# Altium footprint library Metric_SMD.PcbLib: 185 footprints (part 8 of 12)
Each footprint in its own frame and in the unit in brackets; x right, y up, seen from the top. Pads: shape width x height; smd on the part's side, far side on the other; paste and mask are expansions set on the pad; w line width, h text height; cw(c..) or ccw(c..) is an arc to the next point about the centre after c.
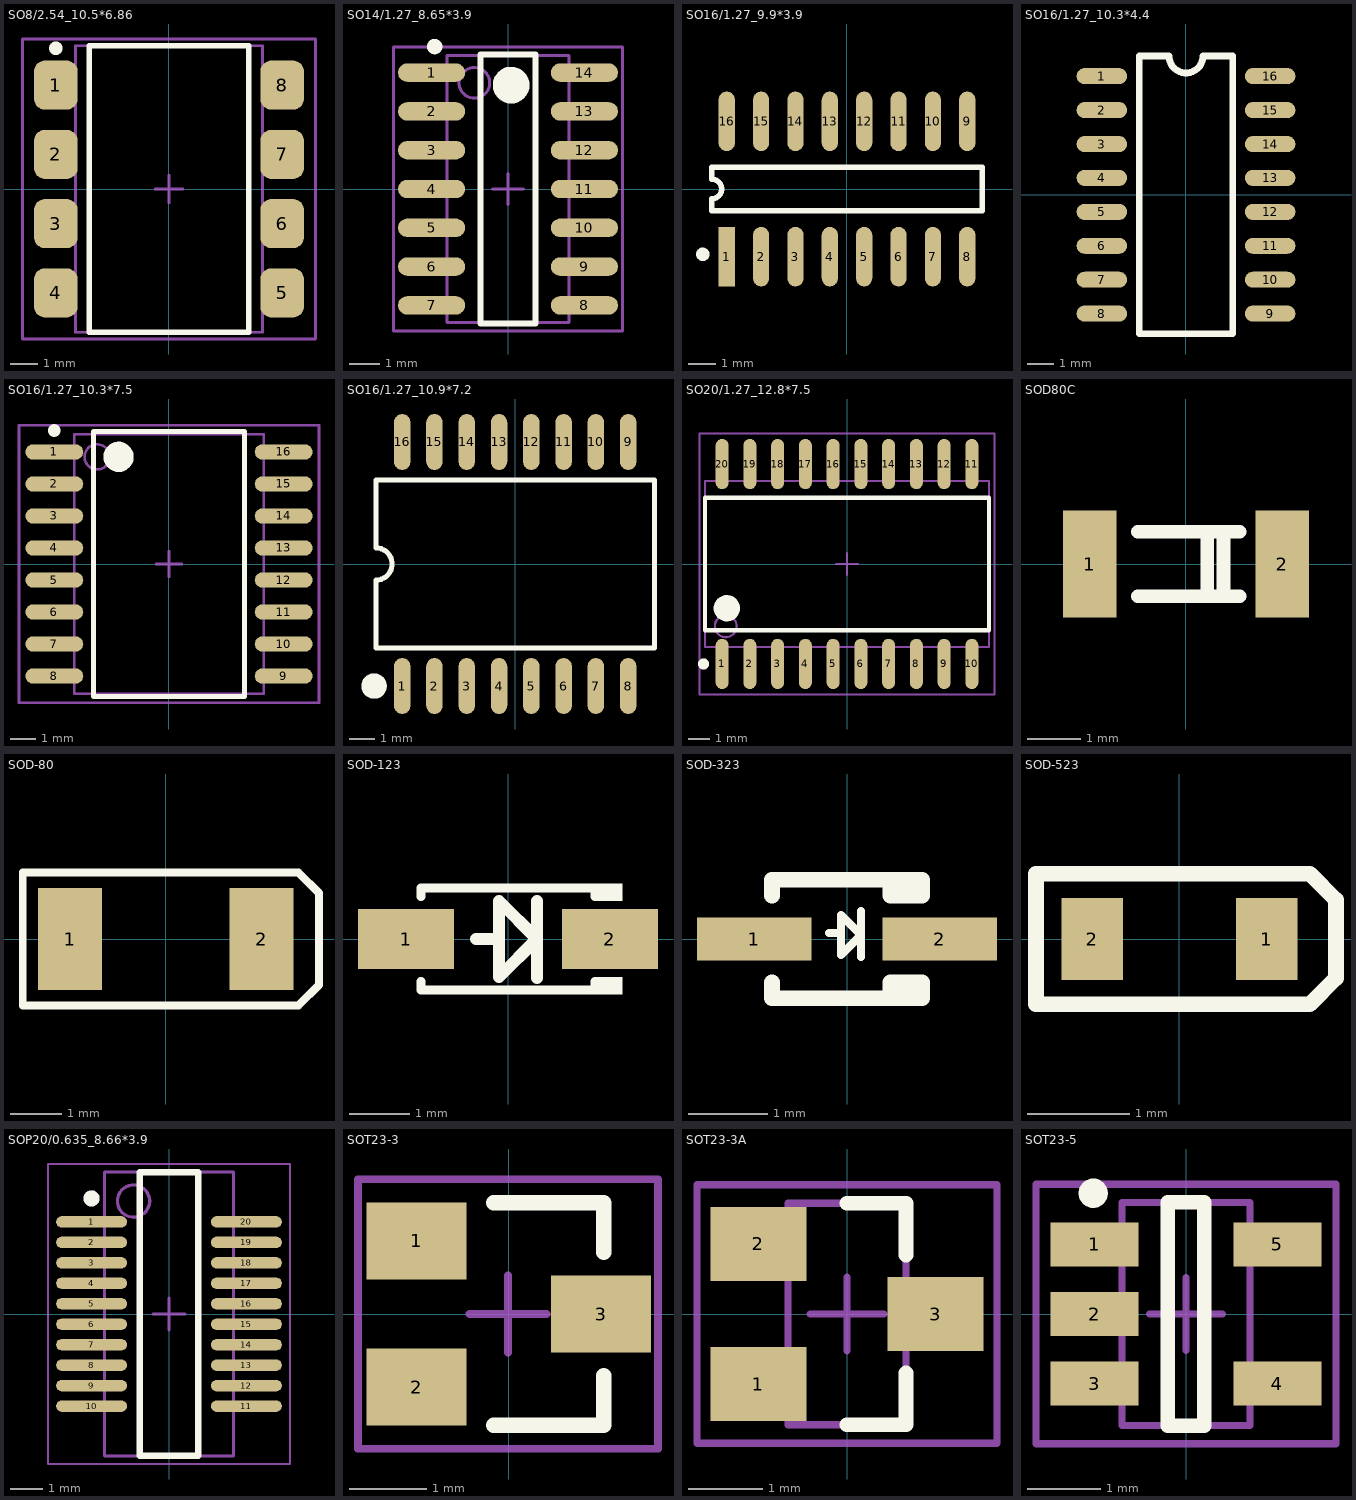
[diagram p7: the footprints below, top view; thin cyan lines are the x and y axes]

## SO8/2.54_10.5*6.86 [mm] "8-Leads, Body 10.5x6.9mm (max), Pitch 2.54mm, IPC Medium Density"
height 5.08
pads (8):
  rrect50% 1.6x1.8 smd: 1(-4.15,3.81) 2(-4.15,1.27) 3(-4.15,-1.27) 4(-4.15,-3.81) 5(4.15,-3.81) 6(4.15,-1.27) 7(4.15,1.27) 8(4.15,3.81)
Top Overlay:
  circle w0.25: c-4.15,5.16 r0.125
  lines w0.2: -2.925,-5.25 2.925,-5.25 2.925,5.25 -2.925,5.25 -2.925,-5.25
Mechanical 13:
  lines w0.1: -3.43,-5.25 3.43,-5.25 3.43,5.25 -3.43,5.25 -3.43,-5.25
Mechanical 15:
  lines w0.1: -0.5,0 0.5,0 ; 0,-0.5 0,0.5 ; -5.375,-5.5 5.375,-5.5 5.375,5.5 -5.375,5.5 -5.375,-5.5
3D body: height 5.08, standoff 0, extent -3.43,-5.25 3.43,5.25

## SO14/1.27_8.65*3.9 [mm] "SOIC, 14-Leads, Body 8.65x3.9mm, Pitch 1.27mm, IPC Medium Density"
height 1.75
pads (14):
  oval 2.2x0.6 smd: 1(-2.5,3.81) 2(-2.5,2.54) 3(-2.5,1.27) 4(-2.5,0) 5(-2.5,-1.27) 6(-2.5,-2.54) 7(-2.5,-3.81) 8(2.5,-3.81) 9(2.5,-2.54) 10(2.5,-1.27) 11(2.5,0) 12(2.5,1.27) 13(2.5,2.54) 14(2.5,3.81)
Top Overlay:
  circle w0.6: c0.1,3.4 r0.3
  circle w0.25: c-2.4,4.66 r0.125
  lines w0.2: -0.9,-4.4 0.9,-4.4 0.9,4.4 -0.9,4.4 -0.9,-4.4
Mechanical 13:
  circle w0.1: c-1.1,3.475 r0.5
  lines w0.1: -2,-4.375 2,-4.375 2,4.375 -2,4.375 -2,-4.375
Mechanical 15:
  lines w0.1: -0.5,0 0.5,0 ; 0,-0.5 0,0.5 ; -3.75,-4.65 3.75,-4.65 3.75,4.65 -3.75,4.65 -3.75,-4.65
3D body: height 1.75, standoff 0, extent -2,-4.375 2,4.375

## SO16/1.27_9.9*3.9 [mm]
height 1.75
pads (16):
  rect 0.6x2.2 smd: 1(-4.445,-2.5)
  oval 0.6x2.2 smd: 2(-3.175,-2.5) 3(-1.905,-2.5) 4(-0.635,-2.5) 5(0.635,-2.5) 6(1.905,-2.5) 7(3.175,-2.5) 8(4.445,-2.5) 9(4.445,2.5) 10(3.175,2.5) 11(1.905,2.5) 12(0.635,2.5) 13(-0.635,2.5) 14(-1.905,2.5) 15(-3.175,2.5) 16(-4.445,2.5)
Top Overlay:
  circle w0.25: c-5.332,-2.413 r0.125
  lines w0.2: -5,-0.8 -5,-0.367 ccw(c-5,0) -5,0.367 -5,0.8 5,0.8 5,-0.8 -5,-0.8

## SO16/1.27_10.3*4.4 [mm] "SOIC, SOP,16-Leads, Body 10.3X4.4mm, Pitch 1.27mm"
height 2.1
pads (16):
  oval 1.9x0.6 smd: 1(-3.15,4.443) 2(-3.15,3.173) 3(-3.15,1.903) 4(-3.15,0.633) 5(-3.15,-0.637) 6(-3.15,-1.907) 7(-3.15,-3.177) 8(-3.15,-4.447) 9(3.15,-4.447) 10(3.15,-3.177) 11(3.15,-1.907) 12(3.15,-0.637) 13(3.15,0.633) 14(3.15,1.903) 15(3.15,3.173) 16(3.15,4.448)
Top Overlay:
  lines w0.254: -1.753,-5.2 1.753,-5.2 ; -1.753,-5.152 -1.753,5.148 ; -1.753,5.2 -0.635,5.2 ccw(c0,5.2) 0.635,5.2 1.753,5.2 ; 1.753,-5.152 1.753,5.148
3D body "User Library-SOIC-16-1.STEP": height 1.4, standoff 0, extent -3,-4.949 3,4.951

## SO16/1.27_10.3*7.5 [mm] "SOIC_W,16-Pin Wide Body Small Outline Integrated Circuit 1.27 mm Pitch, IPC Medium Density"
height 2.65
pads (16):
  oval 2.3x0.6 smd: 1(-4.55,4.445) 2(-4.55,3.175) 3(-4.55,1.905) 4(-4.55,0.635) 5(-4.55,-0.635) 6(-4.55,-1.905) 7(-4.55,-3.175) 8(-4.55,-4.445) 9(4.55,-4.445) 10(4.55,-3.175) 11(4.55,-1.905) 12(4.55,-0.635) 13(4.55,0.635) 14(4.55,1.905) 15(4.55,3.175) 16(4.55,4.445)
Top Overlay:
  circle w0.25: c-4.55,5.295 r0.125
  circle w0.6: c-2,4.25 r0.3
  lines w0.2: -3,-5.25 -3,5.25 3,5.25 3,-5.25 -3,-5.25
Mechanical 13:
  circle w0.1: c-2.85,4.25 r0.5
  lines w0.1: -3.75,-5.15 -3.75,5.15 3.75,5.15 3.75,-5.15 -3.75,-5.15
Mechanical 15:
  lines w0.1: -0.5,0 0.5,0 ; 0,-0.5 0,0.5 ; -5.95,-5.5 -5.95,5.5 5.95,5.5 5.95,-5.5 -5.95,-5.5
3D body "User Library-IPC SOSOIC127P1030X265-16N SOIC 16SOIC05-1-0.STEP": height 2.8, standoff 0, extent -5.2,-5.25 5.156,5.25

## SO16/1.27_10.9*7.2 [mm] "DFP; 16 Leads; Body 10.9 x 7.2 mm (LxW max); Pitch 1.27 mm"
height 2.03
pads (16):
  oval 0.65x2.2 smd: 1(-4.445,-4.8) 2(-3.175,-4.8) 3(-1.905,-4.8) 4(-0.635,-4.8) 5(0.635,-4.8) 6(1.905,-4.8) 7(3.175,-4.8) 8(4.445,-4.8) 9(4.445,4.8) 10(3.175,4.8) 11(1.905,4.8) 12(0.635,4.8) 13(-0.635,4.8) 14(-1.905,4.8) 15(-3.175,4.8) 16(-4.445,4.8)
Top Overlay:
  circle w0.5: c-5.55,-4.8 r0.25
  lines w0.2: -5.475,-3.3 -5.475,-0.635 ccw(c-5.475,0) -5.475,0.635 -5.475,3.3 5.475,3.3 5.475,-3.3 -5.475,-3.3

## SO20/1.27_12.8*7.5 [mm] "SOIC-20W, 20-Leads, Body 13.0x7.6mm (max), Pitch 1.27mm, IPC Medium Density"
height 2.65
pads (20):
  oval 0.6x2.3 smd: 1(-5.715,-4.575) 2(-4.445,-4.575) 3(-3.175,-4.575) 4(-1.905,-4.575) 5(-0.635,-4.575) 6(0.635,-4.575) 7(1.905,-4.575) 8(3.175,-4.575) 9(4.445,-4.575) 10(5.715,-4.575) 11(5.715,4.575) 12(4.445,4.575) 13(3.175,4.575) 14(1.905,4.575) 15(0.635,4.575) 16(-0.635,4.575) 17(-1.905,4.575) 18(-3.175,4.575) 19(-4.445,4.575) 20(-5.715,4.575)
Top Overlay:
  circle w0.25: c-6.565,-4.575 r0.125
  circle w0.6: c-5.5,-2.025 r0.3
  lines w0.2: -6.5,-3.025 6.5,-3.025 6.5,3.025 -6.5,3.025 -6.5,-3.025
Mechanical 13:
  circle w0.1: c-5.55,-2.85 r0.5
  lines w0.1: -6.5,-3.8 6.5,-3.8 6.5,3.8 -6.5,3.8 -6.5,-3.8
Mechanical 15:
  lines w0.1: -0.5,0 0.5,0 ; 0,-0.5 0,0.5 ; -6.75,-5.975 6.75,-5.975 6.75,5.975 -6.75,5.975 -6.75,-5.975
3D body "User Library-SOP20.STEP": height 2, standoff 0, extent -6.35,-3.999 6.35,4.101

## SOD80C [mm] "3.5mm长，1.5mm直径，圆柱型表贴二极管"
height 2
pads (2):
  rect 1x2 smd: 1(-1.8,0) 2(1.8,0)
Top Overlay:
  lines w0.254: -0.9,-0.6 1,-0.6 ; -0.9,0.6 1,0.6 ; 0.4,-0.6 0.4,0.5 ; 0.7,-0.6 0.7,0.5

## SOD-80 [mm] "Mini Metal Electrode Face (MELF) Diode; Body 3.5 x 1.6 mm (LxDia)"
height 1.6
pads (2):
  rect 1.25x2 smd: 1(-1.875,0) 2(1.875,0)
Top Overlay:
  lines w0.152: -2.8,-1.3 2.6,-1.3 3,-0.9 3,0.9 2.6,1.3 -2.8,1.3 -2.8,-1.3
3D body "SW3dPS-SOD80.STEP": height 1.61, standoff 0.01, extent -1.977,-0.864 1.723,0.736

## SOD-123 [mm] "SOD-123; 2 Leads; Body 2.7 x 1.6 mm, (LxW)"
height 1.35
pads (2):
  rect 1.6x1 smd: 1(-1.7,0) 2(1.7,0)
Top Overlay:
  rectangle: 1.45,-0.925 1.912,-0.635
  rectangle: 1.447,0.635 1.909,0.925
  lines w0.15: -1.45,-0.711 -1.45,-0.85 1.45,-0.85 1.45,-0.711 ; -1.45,0.711 -1.45,0.85 1.45,0.85 1.45,0.711
  lines w0.2: -0.533,0 -0.152,0 ; 0.483,-0.65 0.483,0.635 ; -0.152,-0.635 -0.152,0.635 0.483,0 -0.152,-0.635
3D body "User Library-SOD-123_DiodesInc.STEP": height 1.43, standoff -0.02, extent -1.926,-0.825 1.924,0.875

## SOD-323 [mm] "SOD-323/SC-76; 2 Leads; Body 1.7 x 1.3 mm, (LxW)"
height 1.1
pads (2):
  rect 1.45x0.55 smd: 1(-1.175,0) 2(1.175,0)
Top Overlay:
  lines w0.102: -0.229,0.076 -0.076,0.076 ; 0.178,-0.229 0.178,0.356 ; -0.076,-0.203 0,-0.127 0.178,0.051 -0.025,0.254 -0.076,0.305 -0.076,-0.203
  lines w0.2: -0.95,-0.55 -0.95,-0.75 0.95,-0.75 0.95,-0.55 0.55,-0.55 0.55,-0.75 ; -0.95,0.55 -0.95,0.75 0.95,0.75 0.95,0.55 0.55,0.55 0.55,0.75 ; 0.55,0.65 0.95,0.65

## SOD-523 [mm] "1.7X0.9X0.7mm"
height 0.7
pads (2):
  rect 0.6x0.8 smd: 1(0.85,0) 2(-0.85,0)
Top Overlay:
  lines w0.152: -1.397,-0.635 -1.397,0.635 1.27,0.635 1.524,0.381 1.524,-0.381 1.27,-0.635 -1.397,-0.635

## SOP20/0.635_8.66*3.9 [mm] "SOP, 20-Leads, Body 8.66x3.91mm, Pitch 0.635mm, IPC Medium Density"
height 1.76
pads (20):
  oval 2.2x0.35 smd: 1(-2.4,2.857) 2(-2.4,2.222) 3(-2.4,1.587) 4(-2.4,0.953) 5(-2.4,0.318) 6(-2.4,-0.318) 7(-2.4,-0.953) 8(-2.4,-1.587) 9(-2.4,-2.222) 10(-2.4,-2.857) 11(2.4,-2.857) 12(2.4,-2.222) 13(2.4,-1.587) 14(2.4,-0.953) 15(2.4,-0.318) 16(2.4,0.318) 17(2.4,0.953) 18(2.4,1.587) 19(2.4,2.222) 20(2.4,2.857)
Top Overlay:
  circle w0.25: c-2.4,3.582 r0.125
  lines w0.2: -0.9,-4.4 0.9,-4.4 0.9,4.4 -0.9,4.4 -0.9,-4.4
Mechanical 13:
  circle w0.1: c-1.1,3.5 r0.5
  lines w0.1: -2,-4.4 2,-4.4 2,4.4 -2,4.4 -2,-4.4
Mechanical 15:
  lines w0.05: -3.75,-4.65 3.75,-4.65 3.75,4.65 -3.75,4.65 -3.75,-4.65
  lines w0.1: -0.5,0 0.5,0 ; 0,-0.5 0,0.5
3D body: height 1.76, standoff 0.1, extent -2,-4.4 2,4.4

## SOT23-3 [mm] "SOT23(TO-236AB),3-Leads, Body 2.92x1.3mm, Pitch 0.95mm, Lead Span 2.3mm, IPC Medium Density"
height 1.1
pads (3):
  rect 1.3x1 smd: 1(-1.2,0.95) 2(-1.2,-0.95) 3(1.2,0)
Top Overlay:
  lines w0.2: -0.2,-1.448 1.234,-1.448 1.234,-0.8 ; -0.2,1.448 1.234,1.448 1.234,0.8
Mechanical 15:
  lines w0.1: -0.511,0 0.489,0 ; -0.011,-0.5 -0.011,0.5 ; -1.961,-1.75 -1.961,1.75 1.939,1.75 1.939,-1.75 -1.961,-1.75
3D body "User Library-SOT-23-1.STEP": height 0.99, standoff 0.01, extent -1.348,-1.46 1.2,1.46

## SOT23-3A [mm] "SOT23, 3-Leads, Body 2.9x1.6mm, Pitch 0.95mm, Lead Span 2.8mm, IPC Medium Density"
height 1.3
pads (3):
  rect 1.3x1 smd: 1(-1.2,-0.95) 2(-1.2,0.95) 3(1.2,0)
Top Overlay:
  lines w0.2: 0,-1.5 0.8,-1.5 0.8,-0.8 ; 0,1.5 0.8,1.5 0.8,0.8
Mechanical 13:
  lines w0.1: -0.8,-1.5 -0.8,1.5 0.8,1.5 0.8,-1.5 -0.8,-1.5
Mechanical 15:
  lines w0.1: -0.5,0 0.5,0 ; 0,-0.5 0,0.5 ; -2.032,-1.75 -2.032,1.75 2.032,1.75 2.032,-1.75 -2.032,-1.75
3D body: height 1.1, standoff 0, extent -0.8,-1.5 0.8,1.5

## SOT23-5 [mm] "SOT23, 5-Leads, Body 3.0x3.0mm (max), Pitch 0.95mm, IPC Medium Density"
height 1.45
pads (5):
  rect 1.2x0.6 smd: 1(-1.25,0.95) 2(-1.25,0) 3(-1.25,-0.95) 4(1.25,-0.95) 5(1.25,0.95)
Top Overlay:
  circle w0.2: c-1.268,1.651 r0.1
  lines w0.2: -0.25,-1.525 -0.25,1.525 0.25,1.525 0.25,-1.525 -0.25,-1.525
Mechanical 13:
  lines w0.1: -0.875,-1.525 0.875,-1.525 0.875,1.525 -0.875,1.525 -0.875,-1.525
Mechanical 15:
  lines w0.1: -0.5,0 0.5,0 ; 0,-0.5 0,0.5 ; -2.05,-1.775 2.05,-1.775 2.05,1.775 -2.05,1.775 -2.05,-1.775
3D body "User Library-SOT23-5-2.STEP": height 1.45, standoff 0, extent -1.352,-1.501 1.448,1.399